# Altium footprint library chipfc_libs.PCBLIB: 337 footprints (part 7 of 22)
Each footprint in its own frame and in the unit in brackets; x right, y up, seen from the top. Pads: shape width x height; smd on the part's side, far side on the other; paste and mask are expansions set on the pad; w line width, h text height; cw(c..) or ccw(c..) is an arc to the next point about the centre after c.
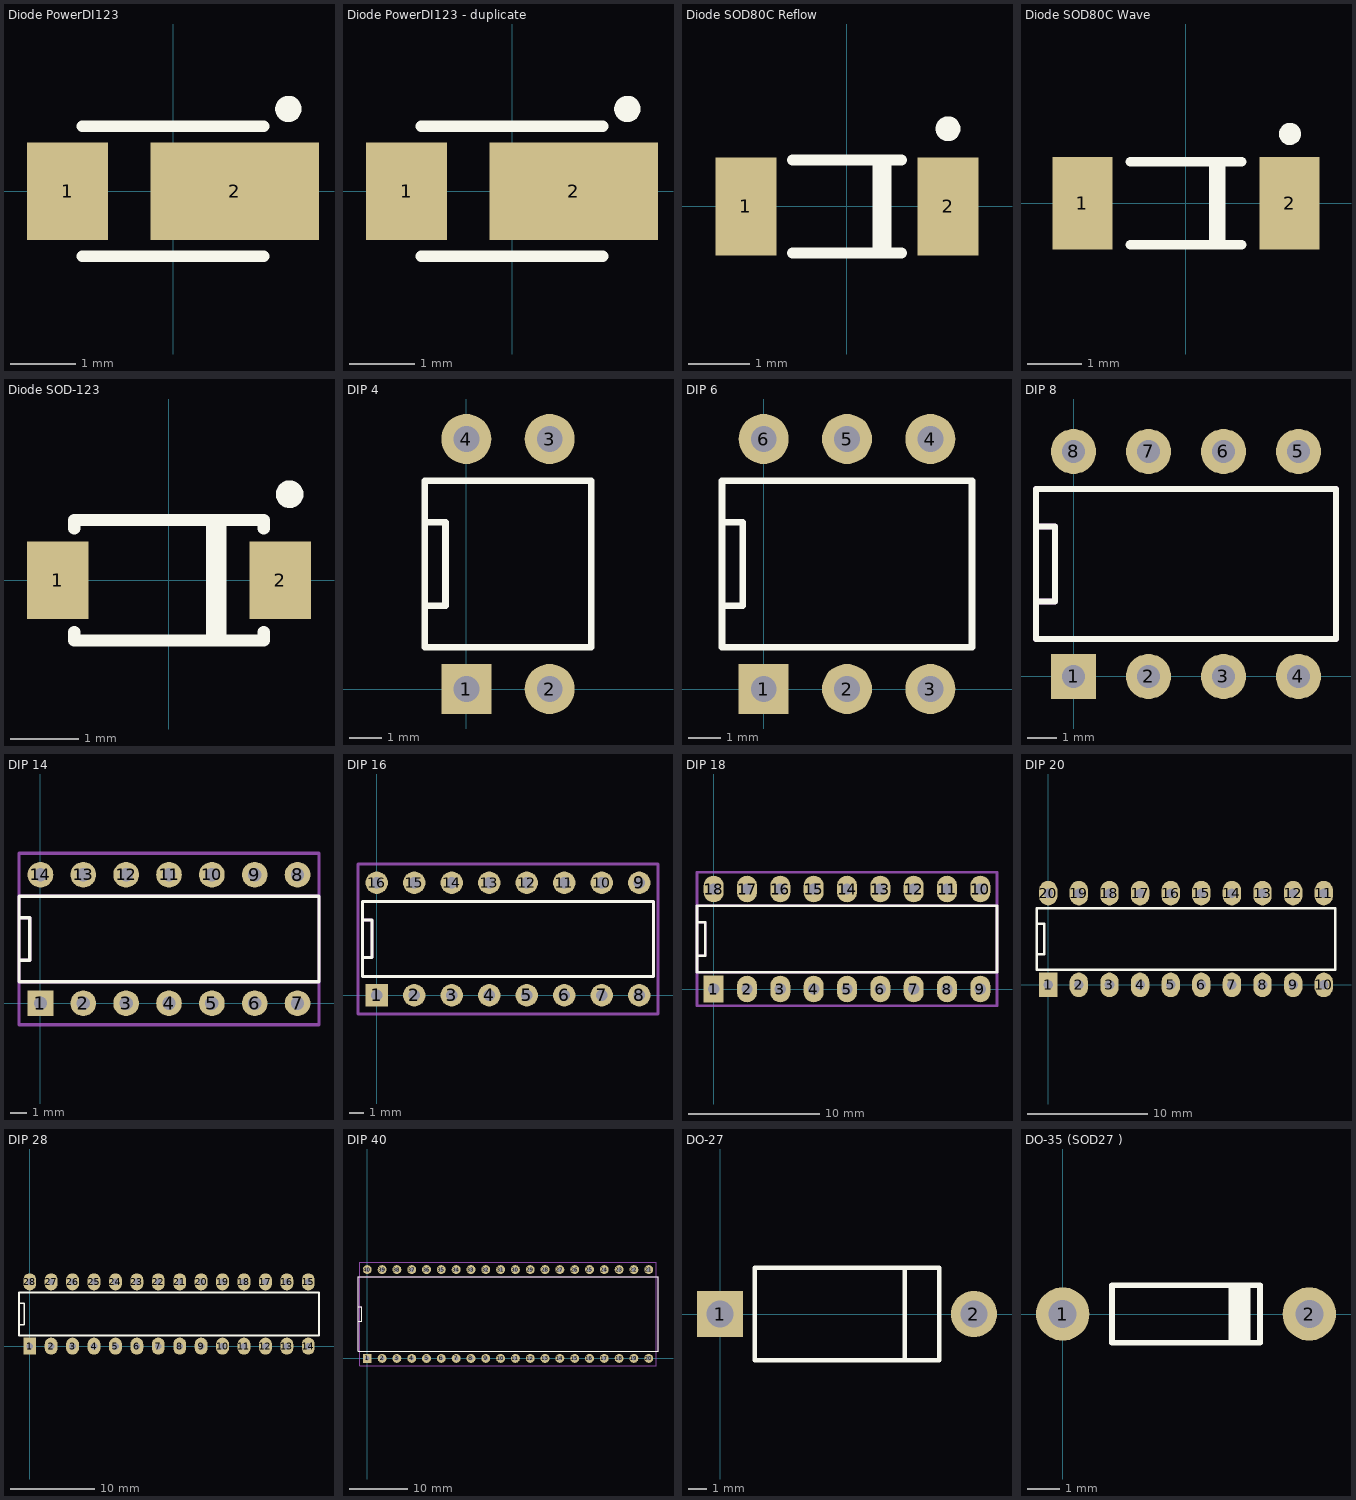
[diagram p6: the footprints below, top view; thin cyan lines are the x and y axes]

## Diode PowerDI123 [mm]
pads (2):
  rect 1.25x1.5 smd: 1(-1.625,0)
  rect 2.6x1.5 smd: 2(0.95,0)
Top Overlay:
  circle w0.203: c1.778,1.27 r0.102
  lines w0.178: -1.397,-1 1.397,-1 ; -1.397,1 1.397,1
3D body "User Library-POWERDI-123.STEP": height 1, standoff 0, extent -1.95,-0.965 1.95,0.965

## Diode PowerDI123 - duplicate [mm]
pads (2):
  rect 1.25x1.5 smd: 1(-1.625,0)
  rect 2.6x1.5 smd: 2(0.95,0)
Top Overlay:
  circle w0.203: c1.778,1.27 r0.102
  lines w0.178: -1.397,-1 1.397,-1 ; -1.397,1 1.397,1
3D body "User Library-POWERDI-123.STEP": height 1, standoff 0, extent -1.95,-0.965 1.95,0.965

## Diode SOD80C Reflow [mm]
pads (2):
  rect 1x1.6 smd: 1(-1.65,0) 2(1.65,0)
Top Overlay:
  circle w0.203: c1.651,1.27 r0.102
  lines w0.178: -0.889,-0.762 0.889,-0.762 ; -0.889,0.762 0.889,0.762 ; 0.508,-0.762 0.508,0.762 ; 0.635,-0.762 0.635,0.762
3D body "User Library-sod80-1-mini-melf-LL4148.step": height 1.44, standoff -0.01, extent -1.75,-0.725 1.75,0.725

## Diode SOD80C Wave [mm]
pads (2):
  rect 1.1x1.7 smd: 1(-1.9,0) 2(1.9,0)
Top Overlay:
  circle w0.203: c1.905,1.27 r0.102
  lines w0.178: -1.016,-0.762 1.016,-0.762 ; -1.016,0.762 1.016,0.762 ; 0.508,-0.762 0.508,0.762 ; 0.635,-0.762 0.635,0.762
3D body "User Library-sod80-1-mini-melf-LL4148.step": height 1.44, standoff -0.01, extent -1.75,-0.725 1.75,0.725

## Diode SOD-123 [mm]
pads (2):
  rect 0.91x1.143 smd: 1(-1.64,0) 2(1.64,0)
Top Overlay:
  circle w0.203: c1.778,1.27 r0.102
  lines w0.178: -1.397,-0.762 -1.397,-0.889 1.397,-0.889 1.397,-0.762 ; -1.397,0.762 -1.397,0.889 1.397,0.889 1.397,0.762 ; 0.635,-0.889 0.635,0.889 ; 0.762,-0.889 0.762,0.889
3D body "User Library-SOD-123 CASE 425-04.STEP": height 1.2, standoff 0, extent -1.65,-0.8 1.65,0.8

## DIP 4 [mil] "DIP IC (2.54mm), 4 pins"
pads (4):
  rect 60x60 / inner round 60 / far side rect 60x80 hole 31: 1(0,0)
  round 60 / inner round 60 / far side oval 60x80 hole 31: 2(100,0) 3(100,300) 4(0,300)
Top Overlay:
  lines w8: -50,100 -25,100 -25,200 -50,200 ; -50,50 150,50 150,250 -50,250 -50,50

## DIP 6 [mil] "DIP IC (2.54mm), 6 pins"
pads (6):
  rect 60x60 / inner round 60 / far side rect 60x80 hole 31: 1(0,0)
  round 60 / inner round 60 / far side oval 60x80 hole 31: 2(100,0) 3(200,0) 4(200,300) 5(100,300) 6(0,300)
Top Overlay:
  lines w8: -50,100 -25,100 -25,200 -50,200 ; -50,50 -50,250 250,250 250,50 -50,50
3D body "User Library-DIP6-White.STEP": height 208.66, standoff -78.74, extent -40,-4.92 240.31,304.92

## DIP 8 [mil] "DIP IC (2.54mm), 8 pins"
pads (8):
  rect 60x60 / inner round 60 / far side rect 60x80 hole 31: 1(0,0)
  round 60 / inner round 60 / far side oval 60x80 hole 31: 2(100,0) 3(200,0) 4(300,0) 5(300,300) 6(200,300) 7(100,300) 8(0,300)
Top Overlay:
  lines w8: -50,100 -25,100 -25,200 -50,200 ; -50,50 -50,250 350,250 350,50 -50,50
Mechanical 1:
  lines w8: -50,100 -25,100 -25,200 -50,200 ; -50,50 -50,250 350,250 350,50 -50,50
3D body "User Library-PDIP-8.step": height 200.79, standoff -125.2, extent -46.85,-15.2 346.85,310

## DIP 14 [mil]
pads (14):
  rect 60x60 / inner round 60 / far side rect 60x80 hole 31: 1(0,0)
  round 60 / inner round 60 / far side oval 60x80 hole 31: 2(100,0) 3(200,0) 4(300,0) 5(400,0) 6(500,0) 7(600,0) 8(600,300) 9(500,300) 10(400,300) 11(300,300) 12(200,300) 13(100,300) 14(0,300)
Top Overlay:
  lines w8: -50,100 -25,100 -25,200 -50,200 ; -50,200 -50,250 650,250 650,50 -50,50 -50,200
Mechanical 1:
  lines w8: -50,100 -25,100 -25,200 -50,200 ; -50,200 -50,250 650,250 650,50 -50,50 -50,200
Mechanical 3:
  lines w8: -50,-50 -50,50 -50,100 -50,350 -47.7,350 650,350 650,250 650,-50 -50,-50

## DIP 16 [mil]
pads (16):
  rect 60x60 / inner round 60 / far side rect 60x80 hole 31: 1(0,0)
  round 60 / inner round 60 / far side oval 60x80 hole 31: 2(100,0) 3(200,0) 4(300,0) 5(400,0) 6(500,0) 7(600,0) 8(700,0) 9(700,300) 10(600,300) 11(500,300) 12(400,300) 13(300,300) 14(200,300) 15(100,300) 16(0,300)
Top Overlay:
  lines w8: -37.5,100 -37.5,200 ; -37.5,100 -37.5,50 737.5,50 737.5,250 -37.5,250 -37.5,200 ; -37.5,100 -12.5,100 -12.5,200 -37.5,200
Mechanical 1:
  lines w8: -37.5,100 -37.5,200 ; -37.5,100 -37.5,50 737.5,50 737.5,250 -37.5,250 -37.5,200 ; -37.5,100 -12.5,100 -12.5,200 -37.5,200
Mechanical 3:
  lines w8: -50,-50 750,-50 750,250 750,350 -50,350 -50,200 -50,100 -50,50 -50,-50

## DIP 18 [mil]
pads (18):
  rect 60x80 hole 34: 1(0,0)
  oval 60x80 hole 34: 2(100,0) 3(200,0) 4(300,0) 5(400,0) 6(500,0) 7(600,0) 8(700,0) 9(800,0) 10(800,300) 11(700,300) 12(600,300) 13(500,300) 14(400,300) 15(300,300) 16(200,300) 17(100,300) 18(0,300)
Top Overlay:
  lines w8: -50,100 -25,100 -25,200 -50,200 ; -50,50 850,50 850,250 -50,250 -50,50
Mechanical 1:
  lines w8: -50,100 -25,100 -25,200 -50,200 ; -50,50 850,50 850,250 -50,250 -50,50
Mechanical 3:
  lines w8: -50,-50 -50,50 -50,100 -50,200 -50,350 850,350 850,246.8 850,49 850,-50 -50,-50

## DIP 20 [mil]
pads (20):
  rect 60x80 hole 31.5: 1(0,0)
  oval 60x80 hole 31.5: 2(100,0) 3(200,0) 4(300,0) 5(400,0) 6(500,0) 7(600,0) 8(700,0) 9(800,0) 10(900,0) 11(900,300) 12(800,300) 13(700,300) 14(600,300) 15(500,300) 16(400,300) 17(300,300) 18(200,300) 19(100,300) 20(0,300)
Top Overlay:
  lines w8: -37.5,100 -12.5,100 -12.5,200 -37.5,200 ; -37.5,100 -37.5,50 937.5,50 937.5,250 -37.5,250 -37.5,200 ; -37.5,100 -37.5,200

## DIP 28 [mil]
pads (28):
  rect 60x80 hole 31.5: 1(0,0)
  oval 60x80 hole 31.5: 2(100,0) 3(200,0) 4(300,0) 5(400,0) 6(500,0) 7(600,0) 8(700,0) 9(800,0) 10(900,0) 11(1000,0) 12(1100,0) 13(1200,0) 14(1300,0) 15(1300,300) 16(1200,300) 17(1100,300) 18(1000,300) 19(900,300) 20(800,300) 21(700,300) 22(600,300) 23(500,300) 24(400,300) 25(300,300) 26(200,300) 27(100,300) 28(0,300)
Top Overlay:
  lines w8: -50,100 -25,100 -25,200 -50,200 ; -50,100 -50,200 ; -50,100 -50,50 1350,50 1350,250 -50,250 -50,200

## DIP 40 [mil]
pads (40):
  rect 60x60 / inner round 60 / far side rect 60x80 hole 31: 1(0,0)
  round 60 / inner round 60 / far side oval 60x80 hole 31: 2(100,0) 3(200,0) 4(300,0) 5(400,0) 6(500,0) 7(600,0) 8(700,0) 9(800,0) 10(900,0) 11(1000,0) 12(1100,0) 13(1200,0) 14(1300,0) 15(1400,0) 16(1500,0) 17(1600,0) 18(1700,0) 19(1800,0) 20(1900,0) 21(1900,600) 22(1800,600) 23(1700,600) 24(1600,600) 25(1500,600) 26(1400,600) 27(1300,600) 28(1200,600) 29(1100,600) 30(1000,600) 31(900,600) 32(800,600) 33(700,600) 34(600,600) 35(500,600) 36(400,600) 37(300,600) 38(200,600) 39(100,600) 40(0,600)
Top Overlay:
  lines w8: -62.5,250 -37.5,250 -37.5,350 -62.5,350 ; -62.5,250 -62.5,50 1962.5,50 1962.5,550 -62.5,550 -62.5,350 ; -62.5,250 -62.5,350
Mechanical 1:
  lines w8: -62.5,250 -37.5,250 -37.5,350 -62.5,350 ; -62.5,250 -62.5,50 1962.5,50 1962.5,550 -62.5,550 -62.5,350 ; -62.5,250 -62.5,350
Mechanical 3:
  lines w8: -50,-50 -50,350 -50,650 1950,650 1950,-50 -50,-50

## DO-27 [mm]
height 2.54
pads (2):
  rect 2.54x2.54 hole 1.5: 1(0,0)
  round 2.54 hole 1.5: 2(13.97,0)
Top Overlay:
  lines w0.254: 10.16,-2.54 10.16,2.54 ; 1.905,-2.54 1.905,2.54 12.065,2.54 12.065,-2.54 1.905,-2.54

## DO-35 (SOD27 ) [mil]
pads (2):
  round 65 hole 34: 1(0,0) 2(300,0)
Top Overlay:
  lines w7: 205,-35 205,35 ; 210,-35 210,35 ; 215,-35 215,35 ; 220,-35 220,35 ; 225,-35 225,35 ; 60,-35 60,35 240,35 240,-35 60,-35
3D body "User Library-DO-35.step": height 77.8, standoff -95.83, extent -11.02,-37.79 311.02,37.8